# Altium footprint library 7.Connectors&Battary_holders.PcbLib: 133 footprints (part 2 of 9)
Each footprint in its own frame and in the unit in brackets; x right, y up, seen from the top. Pads: shape width x height; smd on the part's side, far side on the other; paste and mask are expansions set on the pad; w line width, h text height; cw(c..) or ccw(c..) is an arc to the next point about the centre after c.
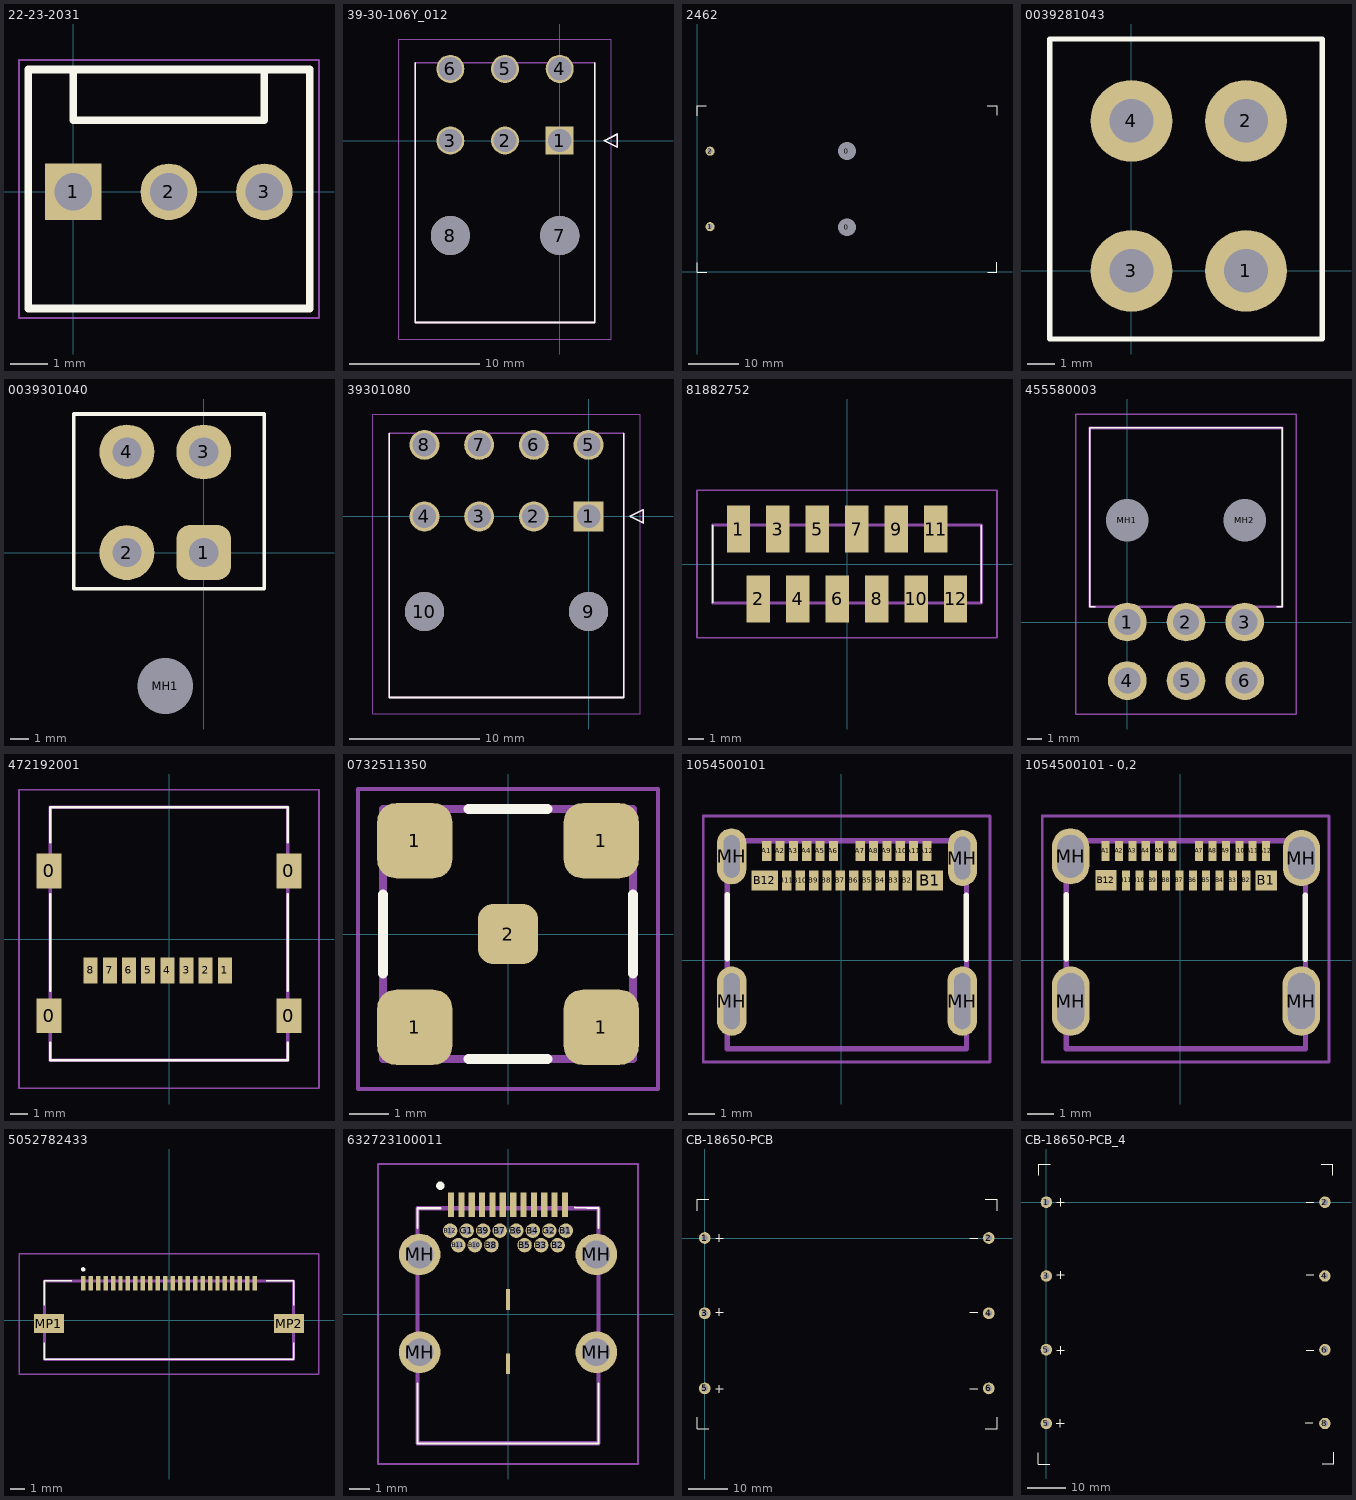
[diagram p1: the footprints below, top view; thin cyan lines are the x and y axes]

## 22-23-2031 [mm]
pads (3):
  rect 1.5x1.5 hole 1: 1(0,0)
  round 1.5 hole 1: 2(2.54,0) 3(5.08,0)
Top Overlay:
  lines w0.2: 0,1.905 0,3.123 ; 0.052,1.905 5.08,1.905 5.08,3.25 ; -1.19,-3.1 -1.19,3.25 6.28,3.25 6.28,-3.1 -1.19,-3.1
Mechanical 13:
  lines w0.1: -1.19,-3.1 6.28,-3.1 6.28,3.25 -1.19,3.25 -1.19,-3.1
Mechanical 15:
  lines w0.05: -1.44,-3.35 6.53,-3.35 6.53,3.5 -1.44,3.5 -1.44,-3.35
3D body "22-23-2031.stp": height 10.66, standoff -3.56, extent -1.184,-3.101 6.284,3.249

## 39-30-106Y_012 [mm]
pads (8):
  rect 2.15x2.15 hole 1.8: 1(0,0)
  round 2.15 hole 1.8: 2(-4.2,0) 3(-8.4,0) 4(0,5.5) 5(-4.2,5.5) 6(-8.4,5.5)
  round 3 hole 3 unplated: 7(0,-7.3) 8(-8.4,-7.3)
Top Overlay:
  lines w0.127: -11.1,5.968 -11.1,-13.968 2.7,-13.968 2.7,5.968 ; 3.429,0 4.429,0.5 4.429,-0.5 3.429,0
Mechanical 13:
  lines w0.127: -11.1,-13.968 -11.1,5.968 2.7,5.968 2.7,-13.968 -11.1,-13.968 ; 3.429,0 4.429,0.5 4.429,-0.5 3.429,0
Mechanical 15:
  lines w0.05: -12.37,-15.238 -12.37,7.794 3.97,7.794 3.97,-15.238 -12.37,-15.238
3D body "39-30-1060.stp": height 11.37, standoff -3.63, extent -11,-13.76 3.197,6.175

## 2462 [mm] "Keystone"
pads (4):
  round 1.8 hole 3.5: 0(29.75,8.875) 0(29.75,23.975)
  round 1.8 hole 1: 1(2.59,8.965) 2(2.59,23.95)
Top Overlay:
  lines w0.15: 0,1.775 0,-0.025 1.975,-0.025 ; 0.002,30.958 0.002,32.924 ; 0.002,32.92 1.837,32.92 ; 57.537,32.92 59.512,32.92 ; 57.675,-0.025 59.51,-0.025 59.51,1.941 ; 59.512,31.124 59.512,32.924
3D body "User Library-R6_AA_UM3-1_5V_holder.step": height 16.11, standoff 1, extent 1.377,-0.085 58.273,32.935

## 0039281043 [mm] "CONN HEADER VERT 4POS 4.2MM"
pads (4):
  round 3 hole 1.6: 1(4.2,0) 2(4.2,5.5) 3(0,0) 4(0,5.5)
Top Overlay:
  lines w0.2: -3,-2.5 -3,8.5 7,8.5 7,-2.5 -3,-2.5
3D body "039281043.stp": height 12.8, standoff -3.5, extent -3.2,-2.3 7.2,8.7

## 0039301040 [mm] "Серия Mini-Fit Jr, гнездо, \"папа\", PIN 4"
pads (5):
  rrect50% 3x3 hole 1.6: 1(0,0)
  round 3 hole 1.6: 2(-4.2,0) 3(0,5.5) 4(-4.2,5.5)
  round 1.525 hole 3.05 unplated: MH1(-2.1,-7.3)
Top Overlay:
  lines w0.2: 3.3,-1.974 -7.1,-1.974 -7.1,7.575 3.3,7.575 3.3,-1.944
3D body "39301040.stp": height 11.4, standoff -3.6, extent -6.9,-13.9 3.1,6.035

## 39301080 [mm]
pads (10):
  rect 2.3x2.3 hole 1.8: 1(0,0)
  round 2.3 hole 1.8: 2(-4.2,0) 3(-8.4,0) 4(-12.6,0) 5(0,5.5) 6(-4.2,5.5) 7(-8.4,5.5) 8(-12.6,5.5)
  round 3 hole 3 unplated: 9(0,-7.3) 10(-12.6,-7.3)
Top Overlay:
  lines w0.127: -15.3,6.4 -15.3,-13.9 2.7,-13.9 2.7,6.4 ; 3.2,0 4.2,0.5 4.2,-0.5 3.2,0
Mechanical 13:
  lines w0.127: -15.3,-13.9 -15.3,6.4 2.7,6.4 2.7,-13.9 -15.3,-13.9 ; 3.2,0 4.2,0.5 4.2,-0.5 3.2,0
Mechanical 15:
  lines w0.05: -16.57,-15.17 -16.57,7.869 3.97,7.869 3.97,-15.17 -16.57,-15.17
3D body "39301080.stp": height 11.21, standoff -3.79, extent -15.1,-13.9 3.297,6.035

## 81882752 [mm]
pads (12):
  rect 1.5x3 smd: 1(-6.985,2.25) 2(-5.715,-2.25) 3(-4.445,2.25) 4(-3.175,-2.25) 5(-1.905,2.25) 6(-0.635,-2.25) 7(0.635,2.25) 8(1.905,-2.25) 9(3.175,2.25) 10(4.445,-2.25) 11(5.715,2.25) 12(6.985,-2.25)
Top Overlay:
  lines w0.1: -8.65,-2.5 -8.65,2.5 ; 8.65,-2.5 8.65,2.5
Mechanical 13:
  lines w0.2: -8.65,-2.5 8.65,-2.5 8.65,2.5 -8.65,2.5 -8.65,-2.5
Mechanical 15:
  lines w0.1: -9.65,-4.75 9.65,-4.75 9.65,4.75 -9.65,4.75 -9.65,-4.75
3D body "8-188275-2.stp": height 5.25, standoff 0, extent -8.585,-3.45 8.585,3.45

## 455580003 [mm]
pads (8):
  round 2.775 hole 1.85: 1(0,0) 2(4.2,0) 3(8.4,0) 4(0,-4.2) 5(4.2,-4.2) 6(8.4,-4.2)
  round 1.525 hole 3.05 unplated: MH1(0,7.3) MH2(8.4,7.3)
Top Overlay:
  lines w0.1: -2.3,1.1 -2.7,1.1 -2.7,13.9 11.1,13.9 11.1,1.1 10.7,1.1
Mechanical 13:
  lines w0.2: -2.7,1.1 -2.7,13.9 11.1,13.9 11.1,1.1 -2.7,1.1
Mechanical 15:
  lines w0.1: -3.7,-6.588 -3.7,14.9 12.1,14.9 12.1,-6.588 -3.7,-6.588
3D body "45558-0003.stp": height 11.05, standoff -3.96, extent -3.057,-4.695 11.14,13.94

## 472192001 [mm]
pads (12):
  rect 1.45x2 smd: 0(-6.875,-4.4) 0(-6.875,3.9) 0(6.875,-4.4) 0(6.875,3.9)
  rect 0.8x1.5 smd: 1(3.205,-1.8) 2(2.105,-1.8) 3(1.005,-1.8) 4(-0.095,-1.8) 5(-1.195,-1.8) 6(-2.295,-1.8) 7(-3.395,-1.8) 8(-4.495,-1.8)
Top Overlay:
  lines w0.15: -6.8,-5.95 -6.8,-6.95 6.8,-6.95 6.8,-5.95 ; -6.8,-2.95 -6.8,2.55 ; -6.8,5.55 -6.8,6.05 -6.8,7.55 6.8,7.55 6.8,6.05 6.8,5.55 ; 6.8,-2.95 6.8,2.55
Mechanical 13:
  lines w0.2: -6.8,-6.95 -6.8,7.55 6.8,7.55 6.8,-6.95 -6.8,-6.95
Mechanical 15:
  lines w0.1: -8.6,-8.55 -8.6,8.55 8.6,8.55 8.6,-8.55 -8.6,-8.55
3D body "47219-2001.stp": height 1.9, standoff 0, extent -7.38,-6.94 7.22,7.56

## 0732511350 [mm]
pads (5):
  rrect50% 1.91x1.91 smd: 1(-2.37,-2.37) 1(-2.37,2.37) 1(2.37,-2.37) 1(2.37,2.37)
  rrect50% 1.52x1.52 smd: 2(0,0)
Top Overlay:
  lines w0.25: -3.175,-1 -3.175,1 ; -1,-3.175 1,-3.175 ; -1,3.175 1,3.175 ; 3.175,-1 3.175,1
Mechanical 13:
  lines w0.2: -3.175,-3.175 -3.175,3.175 3.175,3.175 3.175,-3.175 -3.175,-3.175
Mechanical 15:
  lines w0.1: -3.81,-3.937 -3.81,3.683 3.81,3.683 3.81,-3.937 -3.81,-3.937
3D body "User Library-Con, 142-0711-201.STEP": height 8.84, standoff 0, extent -3.234,-3.234 3.234,3.234

## 1054500101 [mm]
pads (28):
  rect 0.344x0.75 smd: A1(-2.786,4.101) A2(-2.286,4.101) A3(-1.786,4.101) A4(-1.286,4.101) A5(-0.786,4.101) A6(-0.286,4.101) A7(0.714,4.101) A8(1.214,4.101) A9(1.714,4.101) A10(2.214,4.101) A11(2.714,4.101) A12(3.214,4.101)
  rect 1x0.75 smd: B1(3.314,3.001) B12(-2.863,3.001)
  rect 0.35x0.75 smd: B2(2.47,3) B3(1.971,3) B4(1.471,3) B5(0.971,3) B6(0.471,3) B7(-0.029,3) B8(-0.529,3) B9(-1.029,3) B10(-1.529,3) B11(-2.029,3)
  oval 1.1x2.1 hole 0.6 slot 1.6 at 90 deg: MH(-4.1,3.899) MH(4.542,3.835)
  oval 1.1x2.6 hole 0.6 slot 2.1 at 90 deg: MH(-4.094,-1.519) MH(4.535,-1.518)
Top Overlay:
  lines w0.2: -4.262,0.07 -4.262,2.469 ; 4.69,0.051 4.69,2.45
Mechanical 13:
  lines w0.2: -4.266,-3.3 4.695,-3.3 4.695,4.477 -4.266,4.477 -4.266,-3.3
Mechanical 15:
  lines w0.1: -5.158,-3.801 -5.158,5.41 5.572,5.41 5.572,-3.801 -5.158,-3.801
3D body "User Library-1054500101.step": height 3.38, standoff -0.58, extent -4.25,-3.426 4.69,4.474

## 1054500101 - 0,2 [mm]
pads (28):
  rect 0.3x0.75 smd: A1(-2.786,4.101) A2(-2.286,4.101) A3(-1.786,4.101) A4(-1.286,4.101) A5(-0.786,4.101) A6(-0.286,4.101) A7(0.714,4.101) A8(1.214,4.101) A9(1.714,4.101) A10(2.214,4.101) A11(2.714,4.101) A12(3.214,4.101) B2(2.475,3.001) B3(1.977,3.001) B4(1.477,3.001) B5(0.977,3.001) B6(0.477,3.001) B7(-0.023,3.001) B8(-0.523,3.001) B9(-1.023,3.001) B10(-1.523,3.001) B11(-2.023,3.001)
  rect 0.8x0.75 smd: B1(3.229,3.002) B12(-2.776,3.003)
  oval 1.4x2.1 hole 1 slot 1.6 at 90 deg: MH(-4.1,3.899) MH(4.542,3.835)
  oval 1.4x2.6 hole 1 slot 2.1 at 90 deg: MH(-4.094,-1.519) MH(4.535,-1.518)
Top Overlay:
  lines w0.2: -4.262,0.07 -4.262,2.469 ; 4.69,0.051 4.69,2.45
Mechanical 13:
  lines w0.2: -4.266,-3.3 -4.266,4.477 4.695,4.477 4.695,-3.3 -4.266,-3.3
Mechanical 15:
  lines w0.1: -5.158,-3.801 5.572,-3.801 5.572,5.41 -5.158,5.41 -5.158,-3.801
3D body "User Library-1054500101.step": height 3.38, standoff -0.58, extent -4.25,-3.426 4.69,4.474

## 5052782433 [mm]
pads (26):
  rect 0.3x1 smd: 1(-5.75,2.475) 2(-5.25,2.475) 3(-4.75,2.475) 4(-4.25,2.475) 5(-3.75,2.475) 6(-3.25,2.475) 7(-2.75,2.475) 8(-2.25,2.475) 9(-1.75,2.475) 10(-1.25,2.475) 11(-0.75,2.475) 12(-0.25,2.475) 13(0.25,2.475) 14(0.75,2.475) 15(1.25,2.475) 16(1.75,2.475) 17(2.25,2.475) 18(2.75,2.475) 19(3.25,2.475) 20(3.75,2.475) 21(4.25,2.475) 22(4.75,2.475) 23(5.25,2.475) 24(5.75,2.475)
  rect 2x1.3 smd: MP1(-8.05,-0.225) MP2(8.05,-0.225)
Top Overlay:
  lines w0.1: -8.35,-2.625 -8.35,-1.5 -8.35,-2.625 ; -8.35,-2.625 8.35,-2.625 ; -8.35,-2.625 8.35,-2.625 ; -8.35,2.625 -8.35,1 -8.35,2.625 ; -8.35,2.625 -6.5,2.625 -8.35,2.625 ; 8.35,-2.625 8.35,-1.5 8.35,-2.625 ; 8.35,2.625 8.35,1 8.35,2.625 ; 8.35,2.625 6.5,2.625 8.35,2.625
  lines w0.2: -5.8,3.4 ccw(c-5.75,3.4) -5.7,3.4 ; -5.8,3.4 cw(c-5.75,3.4) -5.7,3.4 ; -5.8,3.4 ccw(c-5.75,3.4) -5.7,3.4
Mechanical 13:
  lines w0.2: -8.35,-2.625 -8.35,2.625 8.35,2.625 8.35,-2.625 -8.35,-2.625
Mechanical 15:
  lines w0.1: -10.05,-3.625 -10.05,4.45 10.05,4.45 10.05,-3.625 -10.05,-3.625
3D body "505278-2433.stp": height 2.25, standoff 0, extent -8.92,-2.625 8.92,2.945

## 632723100011 [mm] "USB 3.1 Type C"
pads (32):
  rect 0.3x1.2 smd: A1(-2.75,5.28) A2(-2.25,5.28) A3(-1.75,5.28) A4(-1.25,5.28) A5(-0.75,5.28) A6(-0.25,5.28) A7(0.25,5.28) A8(0.75,5.28) A9(1.25,5.28) A10(1.75,5.28) A11(2.25,5.28) A12(2.75,5.28)
  round 0.7 hole 0.4: B1(2.8,4.03) B2(2.4,3.33) B3(1.6,3.33) B4(1.2,4.03) B5(0.8,3.33) B6(0.4,4.03) B7(-0.4,4.03) B8(-0.8,3.33) B9(-1.2,4.03) B10(-1.6,3.33) B11(-2.4,3.33) B12(-2.8,4.03) G1(-2,4.03) G2(2,4.03)
  round 2.01 hole 1.34: MH(-4.27,-1.85) MH(-4.27,2.88) MH(4.27,-1.85) MH(4.27,2.88)
  rect 0.2x1 smd: MH(0,-2.4) MH(0,0.7)
Top Overlay:
  lines w0.1: -4.37,-3.35 -4.37,-6.25 4.37,-6.25 4.37,-3.35 ; -4.37,4.15 -4.37,5.11 -3.27,5.11 ; 3.23,5.15 4.37,5.11 4.37,4.15
  lines w0.3: -3.27,6.15 cw(c-3.27,6.2) -3.27,6.25 cw(c-3.27,6.2) -3.27,6.15
Mechanical 13:
  lines w0.2: -4.37,-6.25 -4.37,5.11 4.37,5.11 4.37,-6.25 -4.37,-6.25
Mechanical 15:
  lines w0.1: -6.275,-7.25 -6.275,7.25 6.275,7.25 6.275,-7.25 -6.275,-7.25
3D body "632723100011.stp": height 2.93, standoff -1.93, extent -4.37,-6.245 4.37,5.549

## CB-18650-PCB [mm]
pads (6):
  round 3 hole 1.6: 1(0,0) 2(72.9,0) 3(0,-19.3) 4(72.9,-19.3) 5(0,-38.6) 6(72.9,-38.6)
Top Overlay:
  lines w0.254: -2,-46 -2,-49 1,-49 ; -2,7 -2,10 1,10 ; 2.75,-38.75 4.75,-38.75 ; 2.75,-19 4.75,-19 ; 2.75,0 4.75,0 ; 3.75,-39.75 3.75,-37.75 ; 3.75,-20 3.75,-18 ; 3.75,-1 3.75,1 ; 68,-38.75 70,-38.75 ; 68,-19 70,-19 ; 68,0 70,0 ; 72,-49 75,-49 75,-46 ; 72,10 75,10 75,7
3D body "User Library-18650 battery.step": height 24.37, standoff 6.17, extent 4.125,-48.05 69.275,-29.85
3D body "User Library-18650 battery.step": height 24.37, standoff 6.17, extent 3.975,-29.1 69.125,-10.9
3D body "User Library-18650 battery.step": height 24.37, standoff 6.17, extent 4.125,-10.625 69.275,7.575
3D body "BK-18650-PC6.stp": height 23.59, standoff -1.17, extent -2.362,-49.045 75.362,10.645

## CB-18650-PCB_4 [mm]
pads (8):
  round 3 hole 1.6: 1(0,0) 2(72.9,0) 3(0,-19.3) 4(72.9,-19.3) 5(0,-57.9) 5(0,-38.6) 6(72.9,-38.6) 8(72.9,-57.9)
Top Overlay:
  lines w0.254: -2.1,-65.5 -2.1,-68.5 0.9,-68.5 ; -2,7 -2,10 1,10 ; 2.65,-57.85 4.65,-57.85 ; 2.75,-38.75 4.75,-38.75 ; 2.75,-19 4.75,-19 ; 2.75,0 4.75,0 ; 3.65,-58.85 3.65,-56.85 ; 3.75,-39.75 3.75,-37.75 ; 3.75,-20 3.75,-18 ; 3.75,-1 3.75,1 ; 67.7,-57.65 69.7,-57.65 ; 68,-38.75 70,-38.75 ; 68,-19 70,-19 ; 68,0 70,0 ; 72,10 75,10 75,7 ; 72.2,-68.4 75.2,-68.4 75.2,-65.4
3D body "User Library-18650 battery.step": height 24.37, standoff 6.17, extent 4.125,-66.65 69.275,-48.45
3D body "BK-18650-PC6.stp": height 23.59, standoff -1.17, extent -2.324,-68.445 75.4,-8.755
3D body "User Library-18650 battery.step": height 24.37, standoff 6.17, extent 4.125,-48.05 69.275,-29.85
3D body "User Library-18650 battery.step": height 24.37, standoff 6.17, extent 3.975,-29.1 69.125,-10.9
3D body "User Library-18650 battery.step": height 24.37, standoff 6.17, extent 4.125,-10.625 69.275,7.575
3D body "BK-18650-PC6.stp": height 23.59, standoff -1.17, extent -2.362,-49.045 75.362,10.645